# Altium footprint library Package_DFN_QFN.PcbLib: 557 footprints (part 14 of 35)
Each footprint in its own frame and in the unit in brackets; x right, y up, seen from the top. Pads: shape width x height; smd on the part's side, far side on the other; paste and mask are expansions set on the pad; w line width, h text height; cw(c..) or ccw(c..) is an arc to the next point about the centre after c.
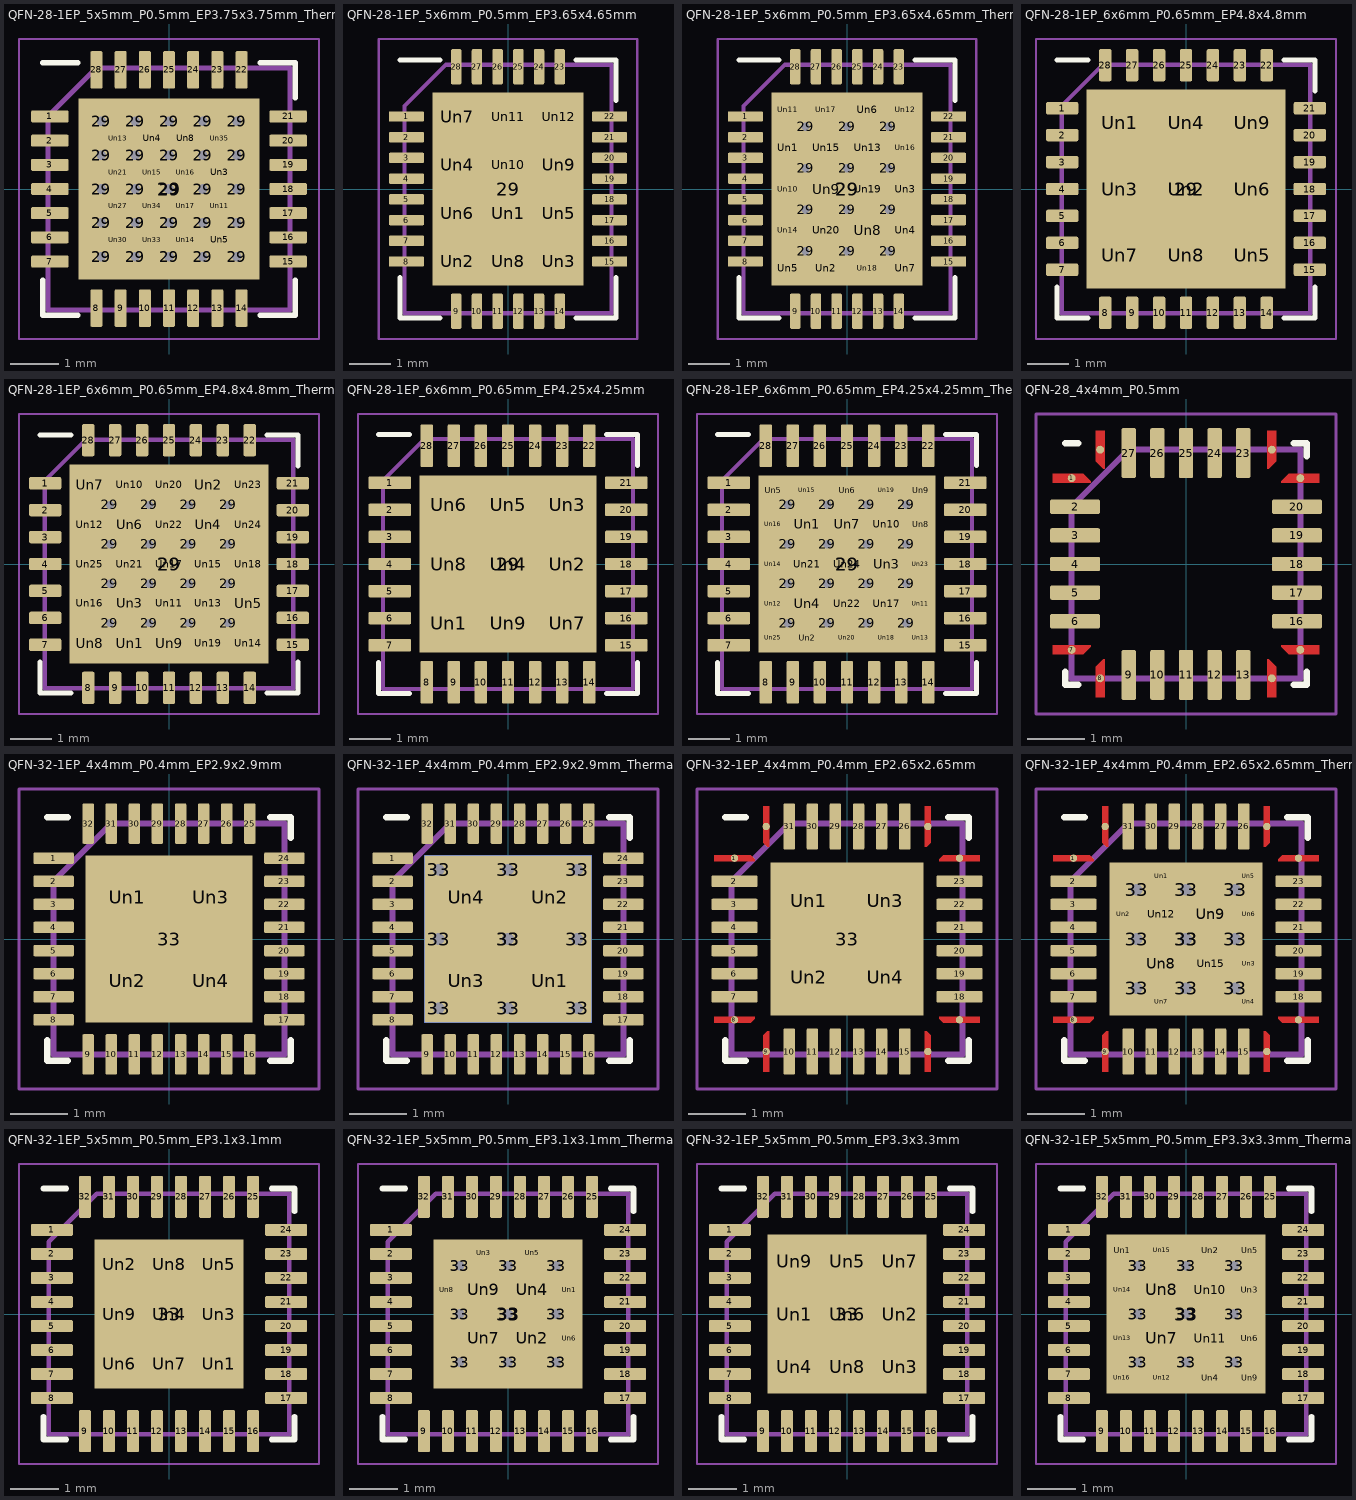
[diagram p13: the footprints below, top view; thin cyan lines are the x and y axes]

## QFN-28-1EP_5x5mm_P0.5mm_EP3.75x3.75mm_ThermalVias [mm]
pads (91):
  rrect25% 0.775x0.25 smd: 1(-2.462,1.5) 2(-2.462,1) 3(-2.462,0.5) 4(-2.462,0) 5(-2.462,-0.5) 6(-2.462,-1) 7(-2.462,-1.5) 15(2.462,-1.5) 16(2.462,-1) 17(2.462,-0.5) 18(2.462,0) 19(2.462,0.5) 20(2.462,1) 21(2.462,1.5)
  rrect25% 0.25x0.775 smd: 8(-1.5,-2.462) 9(-1,-2.462) 10(-0.5,-2.462) 11(0,-2.462) 12(0.5,-2.462) 13(1,-2.462) 14(1.5,-2.462) 22(1.5,2.462) 23(1,2.462) 24(0.5,2.462) 25(0,2.462) 26(-0.5,2.462) 27(-1,2.462) 28(-1.5,2.462)
  round 0.5 hole 0.2: 29(-1.4,-1.4) 29(-1.4,-0.7) 29(-1.4,0) 29(-1.4,0.7) 29(-1.4,1.4) 29(-0.7,-1.4) 29(-0.7,-0.7) 29(-0.7,0) 29(-0.7,0.7) 29(-0.7,1.4) 29(0,-1.4) 29(0,-0.7) 29(0,0) 29(0,0.7) 29(0,1.4) 29(0.7,-1.4) 29(0.7,-0.7) 29(0.7,0) 29(0.7,0.7) 29(0.7,1.4) 29(1.4,-1.4) 29(1.4,-0.7) 29(1.4,0) 29(1.4,0.7) 29(1.4,1.4)
  rect 3.3x3.3 smd far side: 29(0,0)
  rect 3.75x3.75 smd: 29(0,0)
  round 0.248 on Top Paste: Un1(1.637,-1.637) Un10(-1.637,1.637) Un26(-1.637,-1.637) Un29(1.637,1.637)
  round 0.263 on Top Paste: Un2(-1.05,-1.637) Un6(-1.637,-1.05) Un7(-0.35,-1.637) Un9(0.35,-1.637) Un12(-1.637,0.35) Un18(1.637,0.35) Un19(0.35,1.637) Un20(1.05,1.637) Un22(-1.637,1.05) Un23(1.05,-1.637) Un24(-0.35,1.637) Un25(-1.05,1.637) Un28(1.637,-1.05) Un31(-1.637,-0.35) Un32(1.637,1.05) Un36(1.637,-0.35)
  round 0.46 on Top Paste: Un3(1.05,0.35) Un4(-0.35,1.05) Un5(1.05,-1.05) Un8(0.35,1.05) Un11(1.05,-0.35) Un13(-1.05,1.05) Un14(0.35,-1.05) Un15(-0.35,0.35) Un16(0.35,0.35) Un17(0.35,-0.35) Un21(-1.05,0.35) Un27(-1.05,-0.35) Un30(-1.05,-1.05) Un33(-0.35,-1.05) Un34(-0.35,-0.35) Un35(1.05,1.05)
F.SilkS:
  lines w0.12: -2.61,-1.885 -2.61,-2.61 -1.885,-2.61 ; -2.61,2.61 -1.885,2.61 ; 1.885,-2.61 2.61,-2.61 2.61,-1.885 ; 1.885,2.61 2.61,2.61 2.61,1.885
F.Paste:
  drawing of 36 lines, arcs and shapes, not listed
F.CrtYd:
  lines w0.05: -3.1,-3.1 3.1,-3.1 3.1,3.1 -3.1,3.1 -3.1,-3.1
F.Fab:
  lines w0.1: -2.5,-2.5 2.5,-2.5 2.5,2.5 -1.5,2.5 -2.5,1.5 -2.5,-2.5
  text "'.Designator'" at -4.047,-0.84 h1

## QFN-28-1EP_5x6mm_P0.5mm_EP3.65x4.65mm [mm]
pads (41):
  rrect25% 0.85x0.25 smd: 1(-2.45,1.75) 2(-2.45,1.25) 3(-2.45,0.75) 4(-2.45,0.25) 5(-2.45,-0.25) 6(-2.45,-0.75) 7(-2.45,-1.25) 8(-2.45,-1.75) 15(2.45,-1.75) 16(2.45,-1.25) 17(2.45,-0.75) 18(2.45,-0.25) 19(2.45,0.25) 20(2.45,0.75) 21(2.45,1.25) 22(2.45,1.75)
  rrect25% 0.25x0.85 smd: 9(-1.25,-2.95) 10(-0.75,-2.95) 11(-0.25,-2.95) 12(0.25,-2.95) 13(0.75,-2.95) 14(1.25,-2.95) 23(1.25,2.95) 24(0.75,2.95) 25(0.25,2.95) 26(-0.25,2.95) 27(-0.75,2.95) 28(-1.25,2.95)
  rect 3.65x4.65 smd: 29(0,0)
  rrect25% 0.98x0.94 on Top Paste: Un1(0,-0.58) Un2(-1.22,-1.74) Un3(1.22,-1.74) Un4(-1.22,0.58) Un5(1.22,-0.58) Un6(-1.22,-0.58) Un7(-1.22,1.74) Un8(0,-1.74) Un9(1.22,0.58) Un10(0,0.58) Un11(0,1.74) Un12(1.22,1.74)
F.SilkS:
  lines w0.12: -2.61,-2.135 -2.61,-3.11 -1.635,-3.11 ; -2.61,3.11 -1.635,3.11 ; 1.635,-3.11 2.61,-3.11 2.61,-2.135 ; 1.635,3.11 2.61,3.11 2.61,2.135
F.CrtYd:
  lines w0.05: -3.12,-3.62 -3.12,3.62 3.12,3.62 3.12,-3.62 -3.12,-3.62
F.Fab:
  lines w0.1: -2.5,-3 2.5,-3 2.5,3 -1.5,3 -2.5,2 -2.5,-3
  text "'.Designator'" at -4.047,-0.84 h1

## QFN-28-1EP_5x6mm_P0.5mm_EP3.65x4.65mm_ThermalVias [mm]
pads (62):
  rrect25% 0.85x0.25 smd: 1(-2.45,1.75) 2(-2.45,1.25) 3(-2.45,0.75) 4(-2.45,0.25) 5(-2.45,-0.25) 6(-2.45,-0.75) 7(-2.45,-1.25) 8(-2.45,-1.75) 15(2.45,-1.75) 16(2.45,-1.25) 17(2.45,-0.75) 18(2.45,-0.25) 19(2.45,0.25) 20(2.45,0.75) 21(2.45,1.25) 22(2.45,1.75)
  rrect25% 0.25x0.85 smd: 9(-1.25,-2.95) 10(-0.75,-2.95) 11(-0.25,-2.95) 12(0.25,-2.95) 13(0.75,-2.95) 14(1.25,-2.95) 23(1.25,2.95) 24(0.75,2.95) 25(0.25,2.95) 26(-0.25,2.95) 27(-0.75,2.95) 28(-1.25,2.95)
  round 0.5 hole 0.2: 29(-1,-1.5) 29(-1,-0.5) 29(-1,0.5) 29(-1,1.5) 29(0,-1.5) 29(0,-0.5) 29(0,0.5) 29(0,1.5) 29(1,-1.5) 29(1,-0.5) 29(1,0.5) 29(1,1.5)
  rect 3.65x4.65 smd: 29(0,0)
  rect 2.5x3.5 smd far side: 29(0,0)
  round 0.59 on Top Paste: Un1(-1.412,1) Un2(-0.5,-1.913) Un3(1.412,0) Un4(1.412,-1) Un6(0.5,1.913) Un10(-1.412,0) Un14(-1.412,-1) Un16(1.412,1) Un17(-0.5,1.913) Un18(0.5,-1.913)
  round 0.578 on Top Paste: Un5(-1.412,-1.913) Un7(1.412,-1.913) Un11(-1.412,1.913) Un12(1.412,1.913)
  rrect25% 0.806x0.806 on Top Paste: Un8(0.5,-1) Un9(-0.5,0) Un13(0.5,1) Un15(-0.5,1) Un19(0.5,0) Un20(-0.5,-1)
F.SilkS:
  lines w0.12: -2.61,-2.135 -2.61,-3.11 -1.635,-3.11 ; -2.61,3.11 -1.635,3.11 ; 1.635,-3.11 2.61,-3.11 2.61,-2.135 ; 1.635,3.11 2.61,3.11 2.61,2.135
F.Paste:
  region: -1.155,1.266 -1.155,0.734 -1.217,0.672 -1.67,0.672 -1.67,1.328 -1.217,1.328
  region: -0.172,-1.717 -0.172,-2.17 -0.828,-2.17 -0.828,-1.717 -0.766,-1.655 -0.234,-1.655
  region: 1.67,-0.328 1.217,-0.328 1.155,-0.266 1.155,0.266 1.217,0.328 1.67,0.328
  region: 1.67,-1.328 1.217,-1.328 1.155,-1.266 1.155,-0.734 1.217,-0.672 1.67,-0.672
  region: -1.167,-1.739 -1.167,-2.158 -1.658,-2.158 -1.658,-1.667 -1.239,-1.667
  region: 0.828,1.717 0.766,1.655 0.234,1.655 0.172,1.717 0.172,2.17 0.828,2.17
  region: 1.658,-2.158 1.167,-2.158 1.167,-1.739 1.239,-1.667 1.658,-1.667
  region: -1.155,0.266 -1.155,-0.266 -1.217,-0.328 -1.67,-0.328 -1.67,0.328 -1.217,0.328
  region: -1.167,1.739 -1.239,1.667 -1.658,1.667 -1.658,2.158 -1.167,2.158
  region: 1.658,1.667 1.239,1.667 1.167,1.739 1.167,2.158 1.658,2.158
  region: -1.155,-0.734 -1.155,-1.266 -1.217,-1.328 -1.67,-1.328 -1.67,-0.672 -1.217,-0.672
  region: 1.67,0.672 1.217,0.672 1.155,0.734 1.155,1.266 1.217,1.328 1.67,1.328
  region: -0.172,1.717 -0.234,1.655 -0.766,1.655 -0.828,1.717 -0.828,2.17 -0.172,2.17
  region: 0.828,-1.717 0.828,-2.17 0.172,-2.17 0.172,-1.717 0.234,-1.655 0.766,-1.655
F.CrtYd:
  lines w0.05: -3.12,-3.62 -3.12,3.62 3.12,3.62 3.12,-3.62 -3.12,-3.62
F.Fab:
  lines w0.1: -2.5,-3 2.5,-3 2.5,3 -1.5,3 -2.5,2 -2.5,-3
  text "'.Designator'" at -4.047,-0.84 h1

## QFN-28-1EP_6x6mm_P0.65mm_EP4.8x4.8mm [mm]
pads (38):
  rrect25% 0.775x0.3 smd: 1(-2.987,1.95) 2(-2.987,1.3) 3(-2.987,0.65) 4(-2.987,0) 5(-2.987,-0.65) 6(-2.987,-1.3) 7(-2.987,-1.95) 15(2.987,-1.95) 16(2.987,-1.3) 17(2.987,-0.65) 18(2.987,0) 19(2.987,0.65) 20(2.987,1.3) 21(2.987,1.95)
  rrect25% 0.3x0.775 smd: 8(-1.95,-2.987) 9(-1.3,-2.987) 10(-0.65,-2.987) 11(0,-2.987) 12(0.65,-2.987) 13(1.3,-2.987) 14(1.95,-2.987) 22(1.95,2.987) 23(1.3,2.987) 24(0.65,2.987) 25(0,2.987) 26(-0.65,2.987) 27(-1.3,2.987) 28(-1.95,2.987)
  rect 4.8x4.8 smd: 29(0,0)
  rrect19% 1.29x1.29 on Top Paste: Un1(-1.6,1.6) Un2(0,0) Un3(-1.6,0) Un4(0,1.6) Un5(1.6,-1.6) Un6(1.6,0) Un7(-1.6,-1.6) Un8(0,-1.6) Un9(1.6,1.6)
F.SilkS:
  lines w0.12: -3.11,-2.36 -3.11,-3.11 -2.36,-3.11 ; -3.11,3.11 -2.36,3.11 ; 2.36,-3.11 3.11,-3.11 3.11,-2.36 ; 2.36,3.11 3.11,3.11 3.11,2.36
F.CrtYd:
  lines w0.05: -3.62,-3.62 3.62,-3.62 3.62,3.62 -3.62,3.62 -3.62,-3.62
F.Fab:
  lines w0.1: -3,-3 -3,2 -2,3 3,3 3,-3 -3,-3
  text "'.Designator'" at -4.047,-0.84 h1

## QFN-28-1EP_6x6mm_P0.65mm_EP4.8x4.8mm_ThermalVias [mm]
pads (71):
  rrect25% 0.775x0.3 smd: 1(-2.987,1.95) 2(-2.987,1.3) 3(-2.987,0.65) 4(-2.987,0) 5(-2.987,-0.65) 6(-2.987,-1.3) 7(-2.987,-1.95) 15(2.987,-1.95) 16(2.987,-1.3) 17(2.987,-0.65) 18(2.987,0) 19(2.987,0.65) 20(2.987,1.3) 21(2.987,1.95)
  rrect25% 0.3x0.775 smd: 8(-1.95,-2.987) 9(-1.3,-2.987) 10(-0.65,-2.987) 11(0,-2.987) 12(0.65,-2.987) 13(1.3,-2.987) 14(1.95,-2.987) 22(1.95,2.987) 23(1.3,2.987) 24(0.65,2.987) 25(0,2.987) 26(-0.65,2.987) 27(-1.3,2.987) 28(-1.95,2.987)
  round 0.5 hole 0.2: 29(-1.425,-1.425) 29(-1.425,-0.475) 29(-1.425,0.475) 29(-1.425,1.425) 29(-0.475,-1.425) 29(-0.475,-0.475) 29(-0.475,0.475) 29(-0.475,1.425) 29(0.475,-1.425) 29(0.475,-0.475) 29(0.475,0.475) 29(0.475,1.425) 29(1.425,-1.425) 29(1.425,-0.475) 29(1.425,0.475) 29(1.425,1.425)
  rect 3.35x3.35 smd far side: 29(0,0)
  rect 4.8x4.8 smd: 29(0,0)
  rrect25% 0.766x0.786 on Top Paste: Un1(-0.95,-1.913) Un2(0.95,1.913) Un9(0,-1.913) Un10(-0.95,1.913) Un19(0.95,-1.913) Un20(0,1.913)
  rrect25% 0.766x0.766 on Top Paste: Un3(-0.95,-0.95) Un4(0.95,0.95) Un6(-0.95,0.95) Un11(0,-0.95) Un13(0.95,-0.95) Un15(0.95,0) Un17(0,0) Un21(-0.95,0) Un22(0,0.95)
  rrect25% 0.786x0.766 on Top Paste: Un5(1.913,-0.95) Un12(-1.913,0.95) Un16(-1.913,-0.95) Un18(1.913,0) Un24(1.913,0.95) Un25(-1.913,0)
  rrect25% 0.786x0.786 on Top Paste: Un7(-1.913,1.913) Un8(-1.913,-1.913) Un14(1.913,-1.913) Un23(1.913,1.913)
F.SilkS:
  lines w0.12: -3.11,-2.36 -3.11,-3.11 -2.36,-3.11 ; -3.11,3.11 -2.36,3.11 ; 2.36,-3.11 3.11,-3.11 3.11,-2.36 ; 2.36,3.11 3.11,3.11 3.11,2.36
F.CrtYd:
  lines w0.05: -3.62,-3.62 3.62,-3.62 3.62,3.62 -3.62,3.62 -3.62,-3.62
F.Fab:
  lines w0.1: -3,-3 -3,2 -2,3 3,3 3,-3 -3,-3
  text "'.Designator'" at -4.047,-0.84 h1

## QFN-28-1EP_6x6mm_P0.65mm_EP4.25x4.25mm [mm]
pads (38):
  rrect25% 1.025x0.3 smd: 1(-2.838,1.95) 2(-2.838,1.3) 3(-2.838,0.65) 4(-2.838,0) 5(-2.838,-0.65) 6(-2.838,-1.3) 7(-2.838,-1.95) 15(2.838,-1.95) 16(2.838,-1.3) 17(2.838,-0.65) 18(2.838,0) 19(2.838,0.65) 20(2.838,1.3) 21(2.838,1.95)
  rrect25% 0.3x1.025 smd: 8(-1.95,-2.838) 9(-1.3,-2.838) 10(-0.65,-2.838) 11(0,-2.838) 12(0.65,-2.838) 13(1.3,-2.838) 14(1.95,-2.838) 22(1.95,2.838) 23(1.3,2.838) 24(0.65,2.838) 25(0,2.838) 26(-0.65,2.838) 27(-1.3,2.838) 28(-1.95,2.838)
  rect 4.25x4.25 smd: 29(0,0)
  rrect22% 1.14x1.14 on Top Paste: Un1(-1.42,-1.42) Un2(1.42,0) Un3(1.42,1.42) Un4(0,0) Un5(0,1.42) Un6(-1.42,1.42) Un7(1.42,-1.42) Un8(-1.42,0) Un9(0,-1.42)
F.SilkS:
  lines w0.12: -3.11,-2.36 -3.11,-3.11 -2.36,-3.11 ; -3.11,3.11 -2.36,3.11 ; 2.36,-3.11 3.11,-3.11 3.11,-2.36 ; 2.36,3.11 3.11,3.11 3.11,2.36
F.CrtYd:
  lines w0.05: -3.6,-3.6 3.6,-3.6 3.6,3.6 -3.6,3.6 -3.6,-3.6
F.Fab:
  lines w0.1: -3,-3 -3,2 -2,3 3,3 3,-3 -3,-3
  text "'.Designator'" at -4.047,-0.84 h1

## QFN-28-1EP_6x6mm_P0.65mm_EP4.25x4.25mm_ThermalVias [mm]
pads (71):
  rrect25% 1.025x0.3 smd: 1(-2.838,1.95) 2(-2.838,1.3) 3(-2.838,0.65) 4(-2.838,0) 5(-2.838,-0.65) 6(-2.838,-1.3) 7(-2.838,-1.95) 15(2.838,-1.95) 16(2.838,-1.3) 17(2.838,-0.65) 18(2.838,0) 19(2.838,0.65) 20(2.838,1.3) 21(2.838,1.95)
  rrect25% 0.3x1.025 smd: 8(-1.95,-2.838) 9(-1.3,-2.838) 10(-0.65,-2.838) 11(0,-2.838) 12(0.65,-2.838) 13(1.3,-2.838) 14(1.95,-2.838) 22(1.95,2.838) 23(1.3,2.838) 24(0.65,2.838) 25(0,2.838) 26(-0.65,2.838) 27(-1.3,2.838) 28(-1.95,2.838)
  round 0.5 hole 0.2: 29(-1.425,-1.425) 29(-1.425,-0.475) 29(-1.425,0.475) 29(-1.425,1.425) 29(-0.475,-1.425) 29(-0.475,-0.475) 29(-0.475,0.475) 29(-0.475,1.425) 29(0.475,-1.425) 29(0.475,-0.475) 29(0.475,0.475) 29(0.475,1.425) 29(1.425,-1.425) 29(1.425,-0.475) 29(1.425,0.475) 29(1.425,1.425)
  rect 3.35x3.35 smd far side: 29(0,0)
  rect 4.25x4.25 smd: 29(0,0)
  rrect25% 0.766x0.766 on Top Paste: Un1(-0.95,0.95) Un3(0.95,0) Un4(-0.95,-0.95) Un7(0,0.95) Un10(0.95,0.95) Un17(0.95,-0.95) Un21(-0.95,0) Un22(0,-0.95) Un24(0,0)
  round 0.477 on Top Paste: Un2(-0.95,-1.775) Un6(0,1.775) Un8(1.775,0.95) Un11(1.775,-0.95) Un12(-1.775,-0.95) Un14(-1.775,0) Un15(-0.95,1.775) Un16(-1.775,0.95) Un18(0.95,-1.775) Un19(0.95,1.775) Un20(0,-1.775) Un23(1.775,0)
  round 0.46 on Top Paste: Un5(-1.775,1.775) Un9(1.775,1.775) Un13(1.775,-1.775) Un25(-1.775,-1.775)
F.SilkS:
  lines w0.12: -3.11,-2.36 -3.11,-3.11 -2.36,-3.11 ; -3.11,3.11 -2.36,3.11 ; 2.36,-3.11 3.11,-3.11 3.11,-2.36 ; 2.36,3.11 3.11,3.11 3.11,2.36
F.Paste:
  region: -0.654,-1.652 -0.654,-1.97 -1.246,-1.97 -1.246,-1.652 -1.174,-1.58 -0.726,-1.58
  region: -1.597,1.683 -1.683,1.597 -1.953,1.597 -1.953,1.953 -1.597,1.953
  region: 0.296,1.652 0.224,1.58 -0.224,1.58 -0.296,1.652 -0.296,1.97 0.296,1.97
  region: 1.97,0.654 1.652,0.654 1.58,0.726 1.58,1.174 1.652,1.246 1.97,1.246
  region: 1.953,1.597 1.683,1.597 1.597,1.683 1.597,1.953 1.953,1.953
  region: 1.97,-1.246 1.652,-1.246 1.58,-1.174 1.58,-0.726 1.652,-0.654 1.97,-0.654
  region: -1.58,-0.726 -1.58,-1.174 -1.652,-1.246 -1.97,-1.246 -1.97,-0.654 -1.652,-0.654
  region: 1.953,-1.953 1.597,-1.953 1.597,-1.683 1.683,-1.597 1.953,-1.597
  region: -1.58,0.224 -1.58,-0.224 -1.652,-0.296 -1.97,-0.296 -1.97,0.296 -1.652,0.296
  region: -0.654,1.652 -0.726,1.58 -1.174,1.58 -1.246,1.652 -1.246,1.97 -0.654,1.97
  region: -1.58,1.174 -1.58,0.726 -1.652,0.654 -1.97,0.654 -1.97,1.246 -1.652,1.246
  region: 1.246,-1.652 1.246,-1.97 0.654,-1.97 0.654,-1.652 0.726,-1.58 1.174,-1.58
  region: 1.246,1.652 1.174,1.58 0.726,1.58 0.654,1.652 0.654,1.97 1.246,1.97
  region: 0.296,-1.652 0.296,-1.97 -0.296,-1.97 -0.296,-1.652 -0.224,-1.58 0.224,-1.58
  region: 1.97,-0.296 1.652,-0.296 1.58,-0.224 1.58,0.224 1.652,0.296 1.97,0.296
  region: -1.597,-1.683 -1.597,-1.953 -1.953,-1.953 -1.953,-1.597 -1.683,-1.597
F.CrtYd:
  lines w0.05: -3.6,-3.6 3.6,-3.6 3.6,3.6 -3.6,3.6 -3.6,-3.6
F.Fab:
  lines w0.1: -3,-3 3,-3 3,3 -2,3 -3,2 -3,-3
  text "'.Designator'" at -4.047,-0.84 h1

## QFN-28_4x4mm_P0.5mm [mm]
pads (28):
  round 0.137 smd: 1(-1.997,1.5) 7(-1.997,-1.5) 8(-1.5,-1.997) 14(1.5,-1.997) 15(1.997,-1.5) 21(1.997,1.5) 22(1.5,1.997) 28(-1.5,1.997)
  rrect25% 0.875x0.25 smd: 2(-1.937,1) 3(-1.937,0.5) 4(-1.937,0) 5(-1.937,-0.5) 6(-1.937,-1) 16(1.937,-1) 17(1.937,-0.5) 18(1.937,0) 19(1.937,0.5) 20(1.937,1)
  rrect25% 0.25x0.875 smd: 9(-1,-1.937) 10(-0.5,-1.937) 11(0,-1.937) 12(0.5,-1.937) 13(1,-1.937) 23(1,1.937) 24(0.5,1.937) 25(0,1.937) 26(-0.5,1.937) 27(-1,1.937)
F.Cu:
  region: -1.665,1.446 -1.665,1.42 -2.33,1.42 -2.33,1.58 -1.799,1.58
  region: -1.665,-1.446 -1.799,-1.58 -2.33,-1.58 -2.33,-1.42 -1.665,-1.42
  region: -1.42,-2.33 -1.58,-2.33 -1.58,-1.799 -1.446,-1.665 -1.42,-1.665
  region: 1.58,-1.799 1.58,-2.33 1.42,-2.33 1.42,-1.665 1.446,-1.665
  region: 2.33,-1.58 1.799,-1.58 1.665,-1.446 1.665,-1.42 2.33,-1.42
  region: 2.33,1.42 1.665,1.42 1.665,1.446 1.799,1.58 2.33,1.58
  region: 1.58,1.799 1.446,1.665 1.42,1.665 1.42,2.33 1.58,2.33
  region: -1.42,1.665 -1.446,1.665 -1.58,1.799 -1.58,2.33 -1.42,2.33
F.SilkS:
  lines w0.12: -2.11,-1.885 -2.11,-2.11 -1.885,-2.11 ; -2.11,2.11 -1.885,2.11 ; 1.885,-2.11 2.11,-2.11 2.11,-1.885 ; 1.885,2.11 2.11,2.11 2.11,1.885
F.Paste:
  region: -1.665,1.446 -1.665,1.42 -2.33,1.42 -2.33,1.58 -1.799,1.58
  region: -1.665,-1.446 -1.799,-1.58 -2.33,-1.58 -2.33,-1.42 -1.665,-1.42
  region: -1.42,-2.33 -1.58,-2.33 -1.58,-1.799 -1.446,-1.665 -1.42,-1.665
  region: 1.58,-1.799 1.58,-2.33 1.42,-2.33 1.42,-1.665 1.446,-1.665
  region: 2.33,-1.58 1.799,-1.58 1.665,-1.446 1.665,-1.42 2.33,-1.42
  region: 2.33,1.42 1.665,1.42 1.665,1.446 1.799,1.58 2.33,1.58
  region: 1.58,1.799 1.446,1.665 1.42,1.665 1.42,2.33 1.58,2.33
  region: -1.42,1.665 -1.446,1.665 -1.58,1.799 -1.58,2.33 -1.42,2.33
F.Mask:
  region: -1.665,1.446 -1.665,1.42 -2.33,1.42 -2.33,1.58 -1.799,1.58
  region: -1.665,-1.446 -1.799,-1.58 -2.33,-1.58 -2.33,-1.42 -1.665,-1.42
  region: -1.42,-2.33 -1.58,-2.33 -1.58,-1.799 -1.446,-1.665 -1.42,-1.665
  region: 1.58,-1.799 1.58,-2.33 1.42,-2.33 1.42,-1.665 1.446,-1.665
  region: 2.33,-1.58 1.799,-1.58 1.665,-1.446 1.665,-1.42 2.33,-1.42
  region: 2.33,1.42 1.665,1.42 1.665,1.446 1.799,1.58 2.33,1.58
  region: 1.58,1.799 1.446,1.665 1.42,1.665 1.42,2.33 1.58,2.33
  region: -1.42,1.665 -1.446,1.665 -1.58,1.799 -1.58,2.33 -1.42,2.33
F.CrtYd:
  lines w0.05: -2.62,-2.62 -2.62,2.62 2.62,2.62 2.62,-2.62 -2.62,-2.62
F.Fab:
  lines w0.1: -2,-2 -2,1 -1,2 2,2 2,-2 -2,-2
  text "'.Designator'" at -4.047,-0.84 h1

## QFN-32-1EP_4x4mm_P0.4mm_EP2.9x2.9mm [mm]
pads (37):
  rrect25% 0.7x0.2 smd: 1(-2,1.4) 2(-2,1) 3(-2,0.6) 4(-2,0.2) 5(-2,-0.2) 6(-2,-0.6) 7(-2,-1) 8(-2,-1.4) 17(2,-1.4) 18(2,-1) 19(2,-0.6) 20(2,-0.2) 21(2,0.2) 22(2,0.6) 23(2,1) 24(2,1.4)
  rrect25% 0.2x0.7 smd: 9(-1.4,-2) 10(-1,-2) 11(-0.6,-2) 12(-0.2,-2) 13(0.2,-2) 14(0.6,-2) 15(1,-2) 16(1.4,-2) 25(1.4,2) 26(1,2) 27(0.6,2) 28(0.2,2) 29(-0.2,2) 30(-0.6,2) 31(-1,2) 32(-1.4,2)
  rect 2.9x2.9 smd: 33(0,0)
  rrect21% 1.17x1.17 on Top Paste: Un1(-0.725,0.725) Un2(-0.725,-0.725) Un3(0.725,0.725) Un4(0.725,-0.725)
F.SilkS:
  lines w0.12: -2.11,-1.76 -2.11,-2.11 -1.76,-2.11 ; -2.11,2.11 -1.76,2.11 ; 1.76,-2.11 2.11,-2.11 2.11,-1.76 ; 1.76,2.11 2.11,2.11 2.11,1.76
F.CrtYd:
  lines w0.05: -2.6,-2.6 -2.6,2.6 2.6,2.6 2.6,-2.6 -2.6,-2.6
F.Fab:
  lines w0.1: -2,-2 2,-2 2,2 -1,2 -2,1 -2,-2
  text "'.Designator'" at -4.047,-0.84 h1

## QFN-32-1EP_4x4mm_P0.4mm_EP2.9x2.9mm_ThermalVias [mm]
pads (47):
  rrect25% 0.7x0.2 smd: 1(-2,1.4) 2(-2,1) 3(-2,0.6) 4(-2,0.2) 5(-2,-0.2) 6(-2,-0.6) 7(-2,-1) 8(-2,-1.4) 17(2,-1.4) 18(2,-1) 19(2,-0.6) 20(2,-0.2) 21(2,0.2) 22(2,0.6) 23(2,1) 24(2,1.4)
  rrect25% 0.2x0.7 smd: 9(-1.4,-2) 10(-1,-2) 11(-0.6,-2) 12(-0.2,-2) 13(0.2,-2) 14(0.6,-2) 15(1,-2) 16(1.4,-2) 25(1.4,2) 26(1,2) 27(0.6,2) 28(0.2,2) 29(-0.2,2) 30(-0.6,2) 31(-1,2) 32(-1.4,2)
  round 0.5 hole 0.2: 33(-1.2,-1.2) 33(-1.2,0) 33(-1.2,1.2) 33(0,-1.2) 33(0,0) 33(0,1.2) 33(1.2,-1.2) 33(1.2,0) 33(1.2,1.2)
  rect 2.9x2.9 smd: 33(0,0)
  rect 2.9x2.9 smd far side: 33(0,0)
  rrect20% 1.26x1.26 on Top Paste: Un1(0.725,-0.725) Un2(0.725,0.725) Un3(-0.725,-0.725) Un4(-0.725,0.725)
F.SilkS:
  lines w0.12: -2.11,-1.76 -2.11,-2.11 -1.76,-2.11 ; -2.11,2.11 -1.76,2.11 ; 1.76,-2.11 2.11,-2.11 2.11,-1.76 ; 1.76,2.11 2.11,2.11 2.11,1.76
F.CrtYd:
  lines w0.05: -2.6,-2.6 -2.6,2.6 2.6,2.6 2.6,-2.6 -2.6,-2.6
F.Fab:
  lines w0.1: -2,-2 2,-2 2,2 -1,2 -2,1 -2,-2
  text "'.Designator'" at -4.047,-0.84 h1

## QFN-32-1EP_4x4mm_P0.4mm_EP2.65x2.65mm [mm]
pads (37):
  round 0.129 smd: 1(-1.95,1.4) 8(-1.95,-1.4) 9(-1.4,-1.95) 16(1.4,-1.95) 17(1.95,-1.4) 24(1.95,1.4) 25(1.4,1.95) 32(-1.4,1.95)
  rrect25% 0.8x0.2 smd: 2(-1.95,1) 3(-1.95,0.6) 4(-1.95,0.2) 5(-1.95,-0.2) 6(-1.95,-0.6) 7(-1.95,-1) 18(1.95,-1) 19(1.95,-0.6) 20(1.95,-0.2) 21(1.95,0.2) 22(1.95,0.6) 23(1.95,1)
  rrect25% 0.2x0.8 smd: 10(-1,-1.95) 11(-0.6,-1.95) 12(-0.2,-1.95) 13(0.2,-1.95) 14(0.6,-1.95) 15(1,-1.95) 26(1,1.95) 27(0.6,1.95) 28(0.2,1.95) 29(-0.2,1.95) 30(-0.6,1.95) 31(-1,1.95)
  rect 2.65x2.65 smd: 33(0,0)
  rrect23% 1.07x1.07 on Top Paste: Un1(-0.66,0.66) Un2(-0.66,-0.66) Un3(0.66,0.66) Un4(0.66,-0.66)
F.Cu:
  region: -1.6,1.379 -1.6,1.35 -2.3,1.35 -2.3,1.45 -1.671,1.45
  region: -1.6,-1.379 -1.671,-1.45 -2.3,-1.45 -2.3,-1.35 -1.6,-1.35
  region: -1.35,-2.3 -1.45,-2.3 -1.45,-1.671 -1.379,-1.6 -1.35,-1.6
  region: 1.45,-1.671 1.45,-2.3 1.35,-2.3 1.35,-1.6 1.379,-1.6
  region: 2.3,-1.45 1.671,-1.45 1.6,-1.379 1.6,-1.35 2.3,-1.35
  region: 2.3,1.35 1.6,1.35 1.6,1.379 1.671,1.45 2.3,1.45
  region: 1.45,1.671 1.379,1.6 1.35,1.6 1.35,2.3 1.45,2.3
  region: -1.35,1.6 -1.379,1.6 -1.45,1.671 -1.45,2.3 -1.35,2.3
F.SilkS:
  lines w0.12: -2.11,-1.76 -2.11,-2.11 -1.76,-2.11 ; -2.11,2.11 -1.76,2.11 ; 1.76,-2.11 2.11,-2.11 2.11,-1.76 ; 1.76,2.11 2.11,2.11 2.11,1.76
F.Paste:
  region: -1.6,1.379 -1.6,1.35 -2.3,1.35 -2.3,1.45 -1.671,1.45
  region: -1.6,-1.379 -1.671,-1.45 -2.3,-1.45 -2.3,-1.35 -1.6,-1.35
  region: -1.35,-2.3 -1.45,-2.3 -1.45,-1.671 -1.379,-1.6 -1.35,-1.6
  region: 1.45,-1.671 1.45,-2.3 1.35,-2.3 1.35,-1.6 1.379,-1.6
  region: 2.3,-1.45 1.671,-1.45 1.6,-1.379 1.6,-1.35 2.3,-1.35
  region: 2.3,1.35 1.6,1.35 1.6,1.379 1.671,1.45 2.3,1.45
  region: 1.45,1.671 1.379,1.6 1.35,1.6 1.35,2.3 1.45,2.3
  region: -1.35,1.6 -1.379,1.6 -1.45,1.671 -1.45,2.3 -1.35,2.3
F.Mask:
  region: -1.6,1.379 -1.6,1.35 -2.3,1.35 -2.3,1.45 -1.671,1.45
  region: -1.6,-1.379 -1.671,-1.45 -2.3,-1.45 -2.3,-1.35 -1.6,-1.35
  region: -1.35,-2.3 -1.45,-2.3 -1.45,-1.671 -1.379,-1.6 -1.35,-1.6
  region: 1.45,-1.671 1.45,-2.3 1.35,-2.3 1.35,-1.6 1.379,-1.6
  region: 2.3,-1.45 1.671,-1.45 1.6,-1.379 1.6,-1.35 2.3,-1.35
  region: 2.3,1.35 1.6,1.35 1.6,1.379 1.671,1.45 2.3,1.45
  region: 1.45,1.671 1.379,1.6 1.35,1.6 1.35,2.3 1.45,2.3
  region: -1.35,1.6 -1.379,1.6 -1.45,1.671 -1.45,2.3 -1.35,2.3
F.CrtYd:
  lines w0.05: -2.6,-2.6 2.6,-2.6 2.6,2.6 -2.6,2.6 -2.6,-2.6
F.Fab:
  lines w0.1: -2,-2 2,-2 2,2 -1,2 -2,1 -2,-2
  text "'.Designator'" at -4.047,-0.84 h1

## QFN-32-1EP_4x4mm_P0.4mm_EP2.65x2.65mm_ThermalVias [mm]
pads (59):
  round 0.129 smd: 1(-1.95,1.4) 8(-1.95,-1.4) 9(-1.4,-1.95) 16(1.4,-1.95) 17(1.95,-1.4) 24(1.95,1.4) 25(1.4,1.95) 32(-1.4,1.95)
  rrect25% 0.8x0.2 smd: 2(-1.95,1) 3(-1.95,0.6) 4(-1.95,0.2) 5(-1.95,-0.2) 6(-1.95,-0.6) 7(-1.95,-1) 18(1.95,-1) 19(1.95,-0.6) 20(1.95,-0.2) 21(1.95,0.2) 22(1.95,0.6) 23(1.95,1)
  rrect25% 0.2x0.8 smd: 10(-1,-1.95) 11(-0.6,-1.95) 12(-0.2,-1.95) 13(0.2,-1.95) 14(0.6,-1.95) 15(1,-1.95) 26(1,1.95) 27(0.6,1.95) 28(0.2,1.95) 29(-0.2,1.95) 30(-0.6,1.95) 31(-1,1.95)
  round 0.5 hole 0.2: 33(-0.85,-0.85) 33(-0.85,0) 33(-0.85,0.85) 33(0,-0.85) 33(0,0) 33(0,0.85) 33(0.85,-0.85) 33(0.85,0) 33(0.85,0.85)
  rect 2.65x2.65 smd: 33(0,0)
  rect 2.2x2.2 smd far side: 33(0,0)
  round 0.274 on Top Paste: Un1(-0.425,1.088) Un2(-1.088,0.425) Un3(1.088,-0.425) Un6(1.088,0.425) Un7(-0.425,-1.088) Un10(-1.088,-0.425) Un11(0.425,1.088) Un16(0.425,-1.088)
  round 0.248 on Top Paste: Un4(1.088,-1.088) Un5(1.088,1.088) Un13(-1.088,-1.088) Un14(-1.088,1.088)
  round 0.602 on Top Paste: Un8(-0.425,-0.425) Un9(0.425,0.425) Un12(-0.425,0.425) Un15(0.425,-0.425)
F.Cu:
  region: -1.6,1.379 -1.6,1.35 -2.3,1.35 -2.3,1.45 -1.671,1.45
  region: -1.6,-1.379 -1.671,-1.45 -2.3,-1.45 -2.3,-1.35 -1.6,-1.35
  region: -1.35,-2.3 -1.45,-2.3 -1.45,-1.671 -1.379,-1.6 -1.35,-1.6
  region: 1.45,-1.671 1.45,-2.3 1.35,-2.3 1.35,-1.6 1.379,-1.6
  region: 2.3,-1.45 1.671,-1.45 1.6,-1.379 1.6,-1.35 2.3,-1.35
  region: 2.3,1.35 1.6,1.35 1.6,1.379 1.671,1.45 2.3,1.45
  region: 1.45,1.671 1.379,1.6 1.35,1.6 1.35,2.3 1.45,2.3
  region: -1.35,1.6 -1.379,1.6 -1.45,1.671 -1.45,2.3 -1.35,2.3
F.SilkS:
  lines w0.12: -2.11,-1.76 -2.11,-2.11 -1.76,-2.11 ; -2.11,2.11 -1.76,2.11 ; 1.76,-2.11 2.11,-2.11 2.11,-1.76 ; 1.76,2.11 2.11,2.11 2.11,1.76
F.Paste:
  region: -0.178,1.09 -0.276,0.992 -0.574,0.992 -0.672,1.09 -0.672,1.183 -0.178,1.183
  region: -0.992,0.574 -0.992,0.276 -1.09,0.178 -1.183,0.178 -1.183,0.672 -1.09,0.672
  region: 1.183,-0.672 1.09,-0.672 0.992,-0.574 0.992,-0.276 1.09,-0.178 1.183,-0.178
  region: 1.183,-1.183 0.992,-1.183 0.992,-1.126 1.126,-0.992 1.183,-0.992
  region: 1.183,0.992 1.126,0.992 0.992,1.126 0.992,1.183 1.183,1.183
  region: 1.183,0.178 1.09,0.178 0.992,0.276 0.992,0.574 1.09,0.672 1.183,0.672
  region: -0.178,-1.09 -0.178,-1.183 -0.672,-1.183 -0.672,-1.09 -0.574,-0.992 -0.276,-0.992
  region: -0.166,-0.235 -0.166,-0.615 -0.235,-0.684 -0.615,-0.684 -0.684,-0.615 -0.684,-0.235 -0.615,-0.166 -0.235,-0.166
  region: 0.684,0.615 0.684,0.235 0.615,0.166 0.235,0.166 0.166,0.235 0.166,0.615 0.235,0.684 0.615,0.684
  region: -0.992,-0.276 -0.992,-0.574 -1.09,-0.672 -1.183,-0.672 -1.183,-0.178 -1.09,-0.178
  region: 0.672,1.09 0.574,0.992 0.276,0.992 0.178,1.09 0.178,1.183 0.672,1.183
  region: -0.166,0.615 -0.166,0.235 -0.235,0.166 -0.615,0.166 -0.684,0.235 -0.684,0.615 -0.615,0.684 -0.235,0.684
  region: -0.992,-1.126 -0.992,-1.183 -1.183,-1.183 -1.183,-0.992 -1.126,-0.992
  region: -0.992,1.126 -1.126,0.992 -1.183,0.992 -1.183,1.183 -0.992,1.183
  region: 0.684,-0.235 0.684,-0.615 0.615,-0.684 0.235,-0.684 0.166,-0.615 0.166,-0.235 0.235,-0.166 0.615,-0.166
  region: 0.672,-1.09 0.672,-1.183 0.178,-1.183 0.178,-1.09 0.276,-0.992 0.574,-0.992
  region: -1.6,1.379 -1.6,1.35 -2.3,1.35 -2.3,1.45 -1.671,1.45
  region: -1.6,-1.379 -1.671,-1.45 -2.3,-1.45 -2.3,-1.35 -1.6,-1.35
  region: -1.35,-2.3 -1.45,-2.3 -1.45,-1.671 -1.379,-1.6 -1.35,-1.6
  region: 1.45,-1.671 1.45,-2.3 1.35,-2.3 1.35,-1.6 1.379,-1.6
  region: 2.3,-1.45 1.671,-1.45 1.6,-1.379 1.6,-1.35 2.3,-1.35
  region: 2.3,1.35 1.6,1.35 1.6,1.379 1.671,1.45 2.3,1.45
  region: 1.45,1.671 1.379,1.6 1.35,1.6 1.35,2.3 1.45,2.3
  region: -1.35,1.6 -1.379,1.6 -1.45,1.671 -1.45,2.3 -1.35,2.3
F.Mask:
  region: -1.6,1.379 -1.6,1.35 -2.3,1.35 -2.3,1.45 -1.671,1.45
  region: -1.6,-1.379 -1.671,-1.45 -2.3,-1.45 -2.3,-1.35 -1.6,-1.35
  region: -1.35,-2.3 -1.45,-2.3 -1.45,-1.671 -1.379,-1.6 -1.35,-1.6
  region: 1.45,-1.671 1.45,-2.3 1.35,-2.3 1.35,-1.6 1.379,-1.6
  region: 2.3,-1.45 1.671,-1.45 1.6,-1.379 1.6,-1.35 2.3,-1.35
  region: 2.3,1.35 1.6,1.35 1.6,1.379 1.671,1.45 2.3,1.45
  region: 1.45,1.671 1.379,1.6 1.35,1.6 1.35,2.3 1.45,2.3
  region: -1.35,1.6 -1.379,1.6 -1.45,1.671 -1.45,2.3 -1.35,2.3
F.CrtYd:
  lines w0.05: -2.6,-2.6 -2.6,2.6 2.6,2.6 2.6,-2.6 -2.6,-2.6
F.Fab:
  lines w0.1: -2,-2 2,-2 2,2 -1,2 -2,1 -2,-2
  text "'.Designator'" at -4.047,-0.84 h1

## QFN-32-1EP_5x5mm_P0.5mm_EP3.1x3.1mm [mm]
pads (42):
  rrect25% 0.875x0.25 smd: 1(-2.438,1.75) 2(-2.438,1.25) 3(-2.438,0.75) 4(-2.438,0.25) 5(-2.438,-0.25) 6(-2.438,-0.75) 7(-2.438,-1.25) 8(-2.438,-1.75) 17(2.438,-1.75) 18(2.438,-1.25) 19(2.438,-0.75) 20(2.438,-0.25) 21(2.438,0.25) 22(2.438,0.75) 23(2.438,1.25) 24(2.438,1.75)
  rrect25% 0.25x0.875 smd: 9(-1.75,-2.438) 10(-1.25,-2.438) 11(-0.75,-2.438) 12(-0.25,-2.438) 13(0.25,-2.438) 14(0.75,-2.438) 15(1.25,-2.438) 16(1.75,-2.438) 25(1.75,2.438) 26(1.25,2.438) 27(0.75,2.438) 28(0.25,2.438) 29(-0.25,2.438) 30(-0.75,2.438) 31(-1.25,2.438) 32(-1.75,2.438)
  rect 3.1x3.1 smd: 33(0,0)
  rrect25% 0.83x0.83 on Top Paste: Un1(1.03,-1.03) Un2(-1.03,1.03) Un3(1.03,0) Un4(0,0) Un5(1.03,1.03) Un6(-1.03,-1.03) Un7(0,-1.03) Un8(0,1.03) Un9(-1.03,0)
F.SilkS:
  lines w0.12: -2.61,-2.135 -2.61,-2.61 -2.135,-2.61 ; -2.61,2.61 -2.135,2.61 ; 2.135,-2.61 2.61,-2.61 2.61,-2.135 ; 2.135,2.61 2.61,2.61 2.61,2.135
F.CrtYd:
  lines w0.05: -3.12,-3.12 3.12,-3.12 3.12,3.12 -3.12,3.12 -3.12,-3.12
F.Fab:
  lines w0.1: -2.5,-2.5 2.5,-2.5 2.5,2.5 -1.5,2.5 -2.5,1.5 -2.5,-2.5
  text "'.Designator'" at -4.047,-0.84 h1

## QFN-32-1EP_5x5mm_P0.5mm_EP3.1x3.1mm_ThermalVias [mm]
pads (59):
  rrect25% 0.875x0.25 smd: 1(-2.438,1.75) 2(-2.438,1.25) 3(-2.438,0.75) 4(-2.438,0.25) 5(-2.438,-0.25) 6(-2.438,-0.75) 7(-2.438,-1.25) 8(-2.438,-1.75) 17(2.438,-1.75) 18(2.438,-1.25) 19(2.438,-0.75) 20(2.438,-0.25) 21(2.438,0.25) 22(2.438,0.75) 23(2.438,1.25) 24(2.438,1.75)
  rrect25% 0.25x0.875 smd: 9(-1.75,-2.438) 10(-1.25,-2.438) 11(-0.75,-2.438) 12(-0.25,-2.438) 13(0.25,-2.438) 14(0.75,-2.438) 15(1.25,-2.438) 16(1.75,-2.438) 25(1.75,2.438) 26(1.25,2.438) 27(0.75,2.438) 28(0.25,2.438) 29(-0.25,2.438) 30(-0.75,2.438) 31(-1.25,2.438) 32(-1.75,2.438)
  round 0.5 hole 0.2: 33(-1,-1) 33(-1,0) 33(-1,1) 33(0,-1) 33(0,0) 33(0,1) 33(1,-1) 33(1,0) 33(1,1)
  rect 3.1x3.1 smd: 33(0,0)
  rect 2.5x2.5 smd far side: 33(0,0)
  round 0.35 on Top Paste: Un1(1.275,0.5) Un3(-0.5,1.275) Un5(0.5,1.275) Un6(1.275,-0.5) Un8(-1.275,0.5) Un10(-1.275,-0.5) Un12(0.5,-1.275) Un13(-0.5,-1.275)
  rrect25% 0.806x0.806 on Top Paste: Un2(0.5,-0.5) Un4(0.5,0.5) Un7(-0.5,-0.5) Un9(-0.5,0.5)
  round 0.319 on Top Paste: Un11(1.275,-1.275) Un14(1.275,1.275) Un15(-1.275,1.275) Un16(-1.275,-1.275)
F.SilkS:
  lines w0.12: -2.61,-2.135 -2.61,-2.61 -2.135,-2.61 ; -2.61,2.61 -2.135,2.61 ; 2.135,-2.61 2.61,-2.61 2.61,-2.135 ; 2.135,2.61 2.61,2.61 2.61,2.135
F.Paste:
  region: 1.403,0.191 1.225,0.191 1.147,0.268 1.147,0.732 1.225,0.809 1.403,0.809
  region: -0.191,1.225 -0.268,1.147 -0.732,1.147 -0.809,1.225 -0.809,1.403 -0.191,1.403
  region: 0.809,1.225 0.732,1.147 0.268,1.147 0.191,1.225 0.191,1.403 0.809,1.403
  region: 1.403,-0.809 1.225,-0.809 1.147,-0.732 1.147,-0.268 1.225,-0.191 1.403,-0.191
  region: -1.147,0.732 -1.147,0.268 -1.225,0.191 -1.403,0.191 -1.403,0.809 -1.225,0.809
  region: -1.147,-0.268 -1.147,-0.732 -1.225,-0.809 -1.403,-0.809 -1.403,-0.191 -1.225,-0.191
  region: 1.386,-1.386 1.164,-1.386 1.164,-1.275 1.275,-1.164 1.386,-1.164
  region: 0.809,-1.225 0.809,-1.403 0.191,-1.403 0.191,-1.225 0.268,-1.147 0.732,-1.147
  region: -0.191,-1.225 -0.191,-1.403 -0.809,-1.403 -0.809,-1.225 -0.732,-1.147 -0.268,-1.147
  region: 1.386,1.164 1.275,1.164 1.164,1.275 1.164,1.386 1.386,1.386
  region: -1.164,1.275 -1.275,1.164 -1.386,1.164 -1.386,1.386 -1.164,1.386
  region: -1.164,-1.275 -1.164,-1.386 -1.386,-1.386 -1.386,-1.164 -1.275,-1.164
F.CrtYd:
  lines w0.05: -3.12,-3.12 3.12,-3.12 3.12,3.12 -3.12,3.12 -3.12,-3.12
F.Fab:
  lines w0.1: -2.5,-2.5 -2.5,1.5 -1.5,2.5 2.5,2.5 2.5,-2.5 -2.5,-2.5
  text "'.Designator'" at -4.047,-0.84 h1

## QFN-32-1EP_5x5mm_P0.5mm_EP3.3x3.3mm [mm]
pads (42):
  rrect25% 0.875x0.25 smd: 1(-2.438,1.75) 2(-2.438,1.25) 3(-2.438,0.75) 4(-2.438,0.25) 5(-2.438,-0.25) 6(-2.438,-0.75) 7(-2.438,-1.25) 8(-2.438,-1.75) 17(2.438,-1.75) 18(2.438,-1.25) 19(2.438,-0.75) 20(2.438,-0.25) 21(2.438,0.25) 22(2.438,0.75) 23(2.438,1.25) 24(2.438,1.75)
  rrect25% 0.25x0.875 smd: 9(-1.75,-2.438) 10(-1.25,-2.438) 11(-0.75,-2.438) 12(-0.25,-2.438) 13(0.25,-2.438) 14(0.75,-2.438) 15(1.25,-2.438) 16(1.75,-2.438) 25(1.75,2.438) 26(1.25,2.438) 27(0.75,2.438) 28(0.25,2.438) 29(-0.25,2.438) 30(-0.75,2.438) 31(-1.25,2.438) 32(-1.75,2.438)
  rect 3.3x3.3 smd: 33(0,0)
  rrect25% 0.89x0.89 on Top Paste: Un1(-1.1,0) Un2(1.1,0) Un3(1.1,-1.1) Un4(-1.1,-1.1) Un5(0,1.1) Un6(0,0) Un7(1.1,1.1) Un8(0,-1.1) Un9(-1.1,1.1)
F.SilkS:
  lines w0.12: -2.61,-2.135 -2.61,-2.61 -2.135,-2.61 ; -2.61,2.61 -2.135,2.61 ; 2.135,-2.61 2.61,-2.61 2.61,-2.135 ; 2.135,2.61 2.61,2.61 2.61,2.135
F.CrtYd:
  lines w0.05: -3.12,-3.12 -3.12,3.12 3.12,3.12 3.12,-3.12 -3.12,-3.12
F.Fab:
  lines w0.1: -2.5,-2.5 2.5,-2.5 2.5,2.5 -1.5,2.5 -2.5,1.5 -2.5,-2.5
  text "'.Designator'" at -4.047,-0.84 h1

## QFN-32-1EP_5x5mm_P0.5mm_EP3.3x3.3mm_ThermalVias [mm]
pads (59):
  rrect25% 0.875x0.25 smd: 1(-2.438,1.75) 2(-2.438,1.25) 3(-2.438,0.75) 4(-2.438,0.25) 5(-2.438,-0.25) 6(-2.438,-0.75) 7(-2.438,-1.25) 8(-2.438,-1.75) 17(2.438,-1.75) 18(2.438,-1.25) 19(2.438,-0.75) 20(2.438,-0.25) 21(2.438,0.25) 22(2.438,0.75) 23(2.438,1.25) 24(2.438,1.75)
  rrect25% 0.25x0.875 smd: 9(-1.75,-2.438) 10(-1.25,-2.438) 11(-0.75,-2.438) 12(-0.25,-2.438) 13(0.25,-2.438) 14(0.75,-2.438) 15(1.25,-2.438) 16(1.75,-2.438) 25(1.75,2.438) 26(1.25,2.438) 27(0.75,2.438) 28(0.25,2.438) 29(-0.25,2.438) 30(-0.75,2.438) 31(-1.25,2.438) 32(-1.75,2.438)
  round 0.5 hole 0.2: 33(-1,-1) 33(-1,0) 33(-1,1) 33(0,-1) 33(0,0) 33(0,1) 33(1,-1) 33(1,0) 33(1,1)
  rect 2.5x2.5 smd far side: 33(0,0)
  rect 3.3x3.3 smd: 33(0,0)
  round 0.413 on Top Paste: Un1(-1.325,1.325) Un5(1.325,1.325) Un9(1.325,-1.325) Un16(-1.325,-1.325)
  round 0.437 on Top Paste: Un2(0.5,1.325) Un3(1.325,0.5) Un4(0.5,-1.325) Un6(1.325,-0.5) Un12(-0.5,-1.325) Un13(-1.325,-0.5) Un14(-1.325,0.5) Un15(-0.5,1.325)
  rrect25% 0.806x0.806 on Top Paste: Un7(-0.5,-0.5) Un8(-0.5,0.5) Un10(0.5,0.5) Un11(0.5,-0.5)
F.SilkS:
  lines w0.12: -2.61,-2.135 -2.61,-2.61 -2.135,-2.61 ; -2.61,2.61 -2.135,2.61 ; 2.135,-2.61 2.61,-2.61 2.61,-2.135 ; 2.135,2.61 2.61,2.61 2.61,2.135
F.Paste:
  region: -1.174,1.266 -1.266,1.174 -1.476,1.174 -1.476,1.476 -1.174,1.476
  region: 0.816,1.222 0.744,1.15 0.256,1.15 0.184,1.222 0.184,1.5 0.816,1.5
  region: 1.5,0.184 1.222,0.184 1.15,0.256 1.15,0.744 1.222,0.816 1.5,0.816
  region: 0.816,-1.222 0.816,-1.5 0.184,-1.5 0.184,-1.222 0.256,-1.15 0.744,-1.15
  region: 1.476,1.174 1.266,1.174 1.174,1.266 1.174,1.476 1.476,1.476
  region: 1.5,-0.816 1.222,-0.816 1.15,-0.744 1.15,-0.256 1.222,-0.184 1.5,-0.184
  region: 1.476,-1.476 1.174,-1.476 1.174,-1.266 1.266,-1.174 1.476,-1.174
  region: -0.184,-1.222 -0.184,-1.5 -0.816,-1.5 -0.816,-1.222 -0.744,-1.15 -0.256,-1.15
  region: -1.15,-0.256 -1.15,-0.744 -1.222,-0.816 -1.5,-0.816 -1.5,-0.184 -1.222,-0.184
  region: -1.15,0.744 -1.15,0.256 -1.222,0.184 -1.5,0.184 -1.5,0.816 -1.222,0.816
  region: -0.184,1.222 -0.256,1.15 -0.744,1.15 -0.816,1.222 -0.816,1.5 -0.184,1.5
  region: -1.174,-1.266 -1.174,-1.476 -1.476,-1.476 -1.476,-1.174 -1.266,-1.174
F.CrtYd:
  lines w0.05: -3.12,-3.12 3.12,-3.12 3.12,3.12 -3.12,3.12 -3.12,-3.12
F.Fab:
  lines w0.1: -2.5,-2.5 2.5,-2.5 2.5,2.5 -1.5,2.5 -2.5,1.5 -2.5,-2.5
  text "'.Designator'" at -4.047,-0.84 h1